# Altium footprint library Test.PcbLib: 245 footprints (part 7 of 17)
Each footprint in its own frame and in the unit in brackets; x right, y up, seen from the top. Pads: shape width x height; smd on the part's side, far side on the other; paste and mask are expansions set on the pad; w line width, h text height; cw(c..) or ccw(c..) is an arc to the next point about the centre after c.
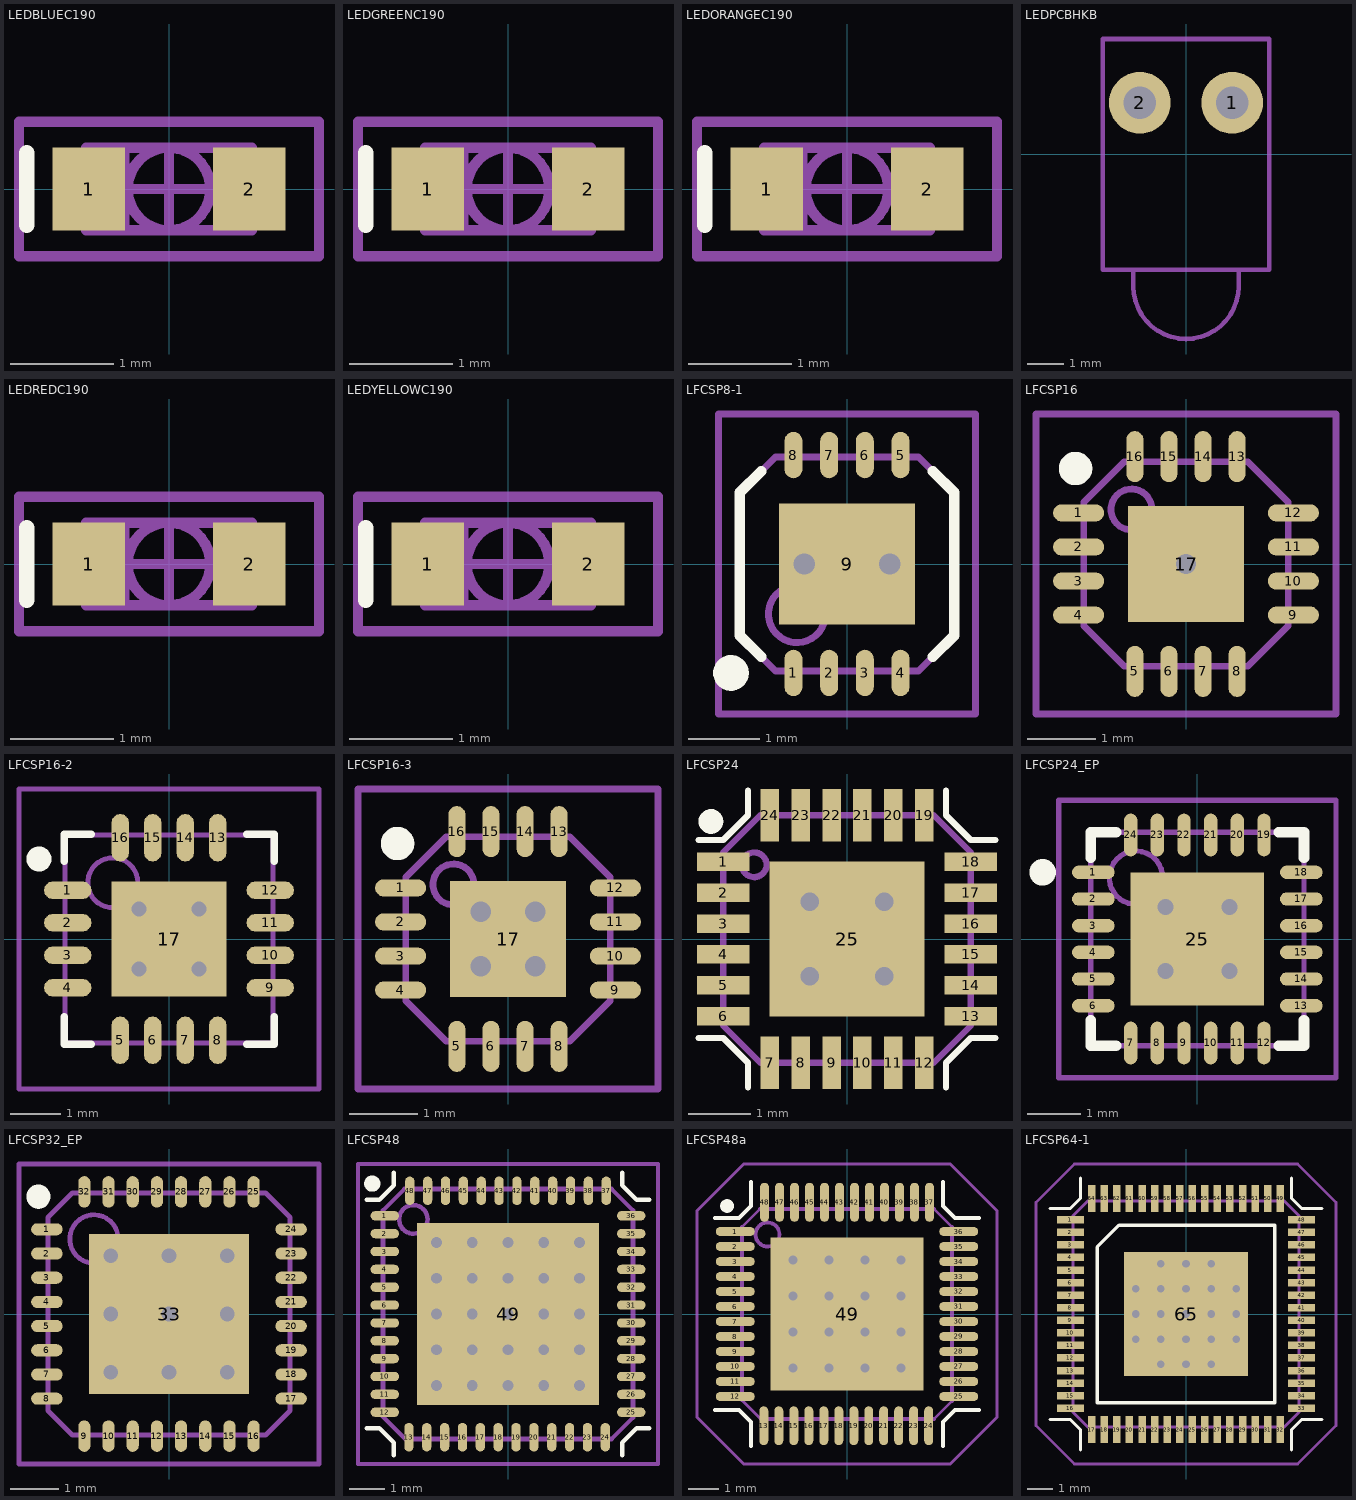
[diagram p6: the footprints below, top view; thin cyan lines are the x and y axes]

## LEDBLUEC190 [mm] "LED chip C190 1.6x0.8x0.8mm vertical"
height 0.8
pads (2):
  rect 0.7x0.8 smd: 1(-0.775,0) 2(0.775,0)
Top Overlay:
  lines w0.15: -1.375,-0.35 -1.375,0.35
Mechanical 13:
  circle w0.102: c0,0 r0.4
  rectangle: -0.8,-0.4 -0.381,0.4
  lines w0.1: -0.8,-0.4 -0.8,0.4 0.8,0.4 0.8,-0.4 -0.8,-0.4
Mechanical 15:
  lines w0.1: -0.4,0 0.4,0 ; 0,-0.4 0,0.4 ; -1.45,-0.65 -1.45,0.65 1.45,0.65 1.45,-0.65 -1.45,-0.65
3D body: height 0.3, standoff 0, extent -0.8,-0.4 0.8,0.4
3D body: height 0.8, standoff 0.3, extent -0.5,-0.4 0.5,0.4

## LEDGREENC190 [mm] "LED chip C190 1.6x0.8x0.8mm vertical"
height 0.8
pads (2):
  rect 0.7x0.8 smd: 1(-0.775,0) 2(0.775,0)
Top Overlay:
  lines w0.15: -1.375,-0.35 -1.375,0.35
Mechanical 13:
  circle w0.102: c0,0 r0.4
  rectangle: -0.8,-0.4 -0.381,0.4
  lines w0.1: -0.8,-0.4 -0.8,0.4 0.8,0.4 0.8,-0.4 -0.8,-0.4
Mechanical 15:
  lines w0.1: -0.4,0 0.4,0 ; 0,-0.4 0,0.4 ; -1.45,-0.65 -1.45,0.65 1.45,0.65 1.45,-0.65 -1.45,-0.65
3D body: height 0.3, standoff 0, extent -0.8,-0.4 0.8,0.4
3D body: height 0.8, standoff 0.3, extent -0.5,-0.4 0.5,0.4

## LEDORANGEC190 [mm] "LED chip C190 1.6x0.8x0.8mm vertical orange"
height 0.8
pads (2):
  rect 0.7x0.8 smd: 1(-0.775,0) 2(0.775,0)
Top Overlay:
  lines w0.15: -1.375,-0.35 -1.375,0.35
Mechanical 13:
  circle w0.102: c0,0 r0.4
  rectangle: -0.8,-0.4 -0.381,0.4
  lines w0.1: -0.8,-0.4 0.8,-0.4 0.8,0.4 -0.8,0.4 -0.8,-0.4
Mechanical 15:
  lines w0.1: -0.4,0 0.4,0 ; 0,-0.4 0,0.4 ; -1.45,-0.65 1.45,-0.65 1.45,0.65 -1.45,0.65 -1.45,-0.65
3D body: height 0.8, standoff 0.3, extent -0.5,-0.4 0.5,0.4
3D body: height 0.3, standoff 0, extent -0.8,-0.4 0.8,0.4

## LEDPCBHKB [mm] "Right angle LED indicator 4.6x6.35x7.3mm"
height 7.5
pads (2):
  round 1.7 hole 0.9: 1(1.27,1.422) 2(-1.27,1.422)
Mechanical 13:
  lines w0.127: -1.448,-3.175 -1.448,-3.632 ccw(c0,-3.632) 1.448,-3.632 1.448,-3.175 ; -2.286,-3.175 -2.286,3.175 2.286,3.175 2.286,-3.175 -2.286,-3.175
3D body: height 7.3, standoff 0, extent -2.286,-3.175 2.286,3.175

## LEDREDC190 [mm] "LED chip C190 1.6x0.8x0.8mm vertical"
height 0.8
pads (2):
  rect 0.7x0.8 smd: 1(-0.775,0) 2(0.775,0)
Top Overlay:
  lines w0.15: -1.375,-0.35 -1.375,0.35
Mechanical 13:
  circle w0.102: c0,0 r0.4
  rectangle: -0.8,-0.4 -0.381,0.4
  lines w0.1: -0.8,-0.4 -0.8,0.4 0.8,0.4 0.8,-0.4 -0.8,-0.4
Mechanical 15:
  lines w0.1: -0.4,0 0.4,0 ; 0,-0.4 0,0.4 ; -1.45,-0.65 -1.45,0.65 1.45,0.65 1.45,-0.65 -1.45,-0.65
3D body: height 0.3, standoff 0, extent -0.8,-0.4 0.8,0.4
3D body: height 0.8, standoff 0.3, extent -0.5,-0.4 0.5,0.4

## LEDYELLOWC190 [mm] "LED chip C190 1.6x0.8x0.8mm vertical"
height 0.8
pads (2):
  rect 0.7x0.8 smd: 1(-0.775,0) 2(0.775,0)
Top Overlay:
  lines w0.15: -1.375,-0.35 -1.375,0.35
Mechanical 13:
  circle w0.102: c0,0 r0.4
  rectangle: -0.8,-0.4 -0.381,0.4
  lines w0.1: -0.8,-0.4 -0.8,0.4 0.8,0.4 0.8,-0.4 -0.8,-0.4
Mechanical 15:
  lines w0.1: -0.4,0 0.4,0 ; 0,-0.4 0,0.4 ; -1.45,-0.65 -1.45,0.65 1.45,0.65 1.45,-0.65 -1.45,-0.65
3D body: height 0.3, standoff 0, extent -0.8,-0.4 0.8,0.4
3D body: height 0.8, standoff 0.3, extent -0.5,-0.4 0.5,0.4

## LFCSP8-1 [mm]
height 0.9
pads (9):
  oval 0.25x0.65 smd mask+0.038: 1(-0.75,-1.525) 2(-0.25,-1.525) 3(0.25,-1.525) 4(0.75,-1.525) 5(0.75,1.525) 6(0.25,1.525) 7(-0.25,1.525) 8(-0.75,1.525)
  rect 1.9x1.7 smd paste-4 mask-4: 9(0,0)
via 0.6,0 diameter 0.65 hole 0.3
via -0.6,0 diameter 0.65 hole 0.3
Top Overlay:
  circle w0.25: c-1.625,-1.525 r0.125
  lines w0.15: -1.2,-1.3 -1.5,-1 -1.5,1 -1.2,1.3 ; 1.2,-1.3 1.5,-1 1.5,1 1.2,1.3
Top Paste:
  region: -0.95,-0.85 -0.95,-0.3 -0.45,-0.3 -0.3,-0.15 0.3,-0.15 0.45,-0.3 0.95,-0.3 0.95,-0.85
  region: -0.95,0.85 -0.95,0.3 -0.45,0.3 -0.3,0.15 0.3,0.15 0.45,0.3 0.95,0.3 0.95,0.85
Top Solder:
  region: 1,0.9 0.6,0.9 0.6,0.331 0.727,0.306 0.834,0.234 0.906,0.127 0.931,0 0.906,-0.127 0.834,-0.234 0.727,-0.306 0.6,-0.331 0.473,-0.306 0.366,-0.234 0.294,-0.127 0.269,0 0.275,0 0.269,0 0.294,0.127 0.366,0.234 0.473,0.306 0.6,0.331 0.6,0.325 0.6,0.9 0,0.9 0,-0.9 1,-0.9
  region: -1,0.9 -0.6,0.9 -0.6,0.331 -0.727,0.306 -0.834,0.234 -0.906,0.127 -0.931,0 -0.906,-0.127 -0.834,-0.234 -0.727,-0.306 -0.6,-0.331 -0.473,-0.306 -0.366,-0.234 -0.294,-0.127 -0.269,0 -0.275,0 -0.269,0 -0.294,0.127 -0.366,0.234 -0.473,0.306 -0.6,0.331 -0.6,0.325 -0.6,0.9 0,0.9 0,-0.9 -1,-0.9
Mechanical 13:
  circle w0.1: c-0.7,-0.7 r0.4
  lines w0.1: -1.5,-1 -1,-1.5 1,-1.5 1.5,-1 1.5,1 1,1.5 -1,1.5 -1.5,1 -1.5,-1
Mechanical 15:
  lines w0.1: -0.5,0 0.5,0 ; 0,-0.5 0,0.5 ; -1.8,-2.1 1.8,-2.1 1.8,2.1 -1.8,2.1 -1.8,-2.1
3D body: height 0.91, standoff 0.9, extent -1.108,-1.108 -0.292,-0.292
3D body: height 0.9, standoff 0.6, extent -1.3,-1.3 1.3,1.3
3D body: height 0.6, standoff 0.02, extent -1.5,-1.5 1.5,1.5

## LFCSP16 [mm] "Lead Frame Chip Scale Package 16 pin 3x3mm R0.5mm"
height 0.9
pads (17):
  oval 0.75x0.25 smd mask+0.051: 1(-1.575,0.75) 2(-1.575,0.25) 3(-1.575,-0.25) 4(-1.575,-0.75) 9(1.575,-0.75) 10(1.575,-0.25) 11(1.575,0.25) 12(1.575,0.75)
  oval 0.25x0.75 smd mask+0.051: 5(-0.75,-1.575) 6(-0.25,-1.575) 7(0.25,-1.575) 8(0.75,-1.575) 13(0.75,1.575) 14(0.25,1.575) 15(-0.25,1.575) 16(-0.75,1.575)
  rect 1.7x1.7 smd paste-7 mask-7: 17(0,0)
via 0,0 diameter 0.65 hole 0.3
Top Overlay:
  circle w0.25: c-1.62,1.4 r0.12
Top Paste:
  region: 0.85,-0.85 0.15,-0.85 0.15,-0.275 0.275,-0.15 0.85,-0.15
  region: 0.85,0.85 0.85,0.15 0.275,0.15 0.15,0.275 0.15,0.85
  region: -0.85,0.85 -0.15,0.85 -0.15,0.275 -0.275,0.15 -0.85,0.15
  region: -0.85,-0.85 -0.85,-0.15 -0.275,-0.15 -0.15,-0.275 -0.15,-0.85
Top Solder:
  circle w0.102: c0,0 r0.381
  region: -0.9,0.9 0.9,0.9 0.9,-0.9 0,-0.9 0,-0.375 0.125,-0.375 0.225,-0.275 0.275,-0.275 0.325,-0.225 0.325,-0.175 0.381,-0.119 0.381,0.144 0.15,0.375 -0.1,0.375 -0.15,0.325 -0.25,0.325 -0.325,0.25 -0.325,0.175 -0.375,0.125 -0.375,-0.15 -0.25,-0.275 -0.25,-0.3 -0.2,-0.35 -0.1,-0.35 -0.075,-0.375 0,-0.375 0,-0.9 -0.9,-0.9
Mechanical 13:
  circle w0.1: c-0.8,0.8 r0.3
  lines w0.1: -1.5,-0.9 -0.9,-1.5 0.9,-1.5 1.5,-0.9 1.5,0.9 0.9,1.5 -0.9,1.5 -1.5,0.9 -1.5,-0.9
Mechanical 15:
  lines w0.1: -0.5,0 0.5,0 ; 0,-0.5 0,0.5 ; -2.2,-2.2 2.2,-2.2 2.2,2.2 -2.2,2.2 -2.2,-2.2
3D body: height 0.9, standoff 0.02, extent -1.5,-1.5 1.5,1.5

## LFCSP16-2 [mm] "LFCSP_LQ, 16-Leads, Body 4x4mm , Pitch 0,65mm, IPC Low Density"
height 1.5
pads (17):
  oval 0.95x0.35 smd mask+0.051: 1(-2.025,0.975) 2(-2.025,0.325) 3(-2.025,-0.325) 4(-2.025,-0.975) 9(2.025,-0.975) 10(2.025,-0.325) 11(2.025,0.325) 12(2.025,0.975)
  oval 0.35x0.95 smd mask+0.051: 5(-0.975,-2.025) 6(-0.325,-2.025) 7(0.325,-2.025) 8(0.975,-2.025) 13(0.975,2.025) 14(0.325,2.025) 15(-0.325,2.025) 16(-0.975,2.025)
  rect 2.3x2.3 smd paste-5 mask-3: 17(0,0)
via 0.6,-0.6 diameter 0.65 hole 0.3
via -0.6,-0.6 diameter 0.65 hole 0.3
via 0.6,0.6 diameter 0.65 hole 0.3
via -0.6,0.6 diameter 0.65 hole 0.3
Top Overlay:
  circle w0.25: c-2.6,1.6 r0.125
  lines w0.15: -2.1,-1.55 -2.1,-2.1 -1.55,-2.1 ; -2.1,1.55 -2.1,2.1 -1.55,2.1 ; 1.55,-2.1 2.1,-2.1 2.1,-1.55 ; 1.55,2.1 2.1,2.1 2.1,1.55
Top Paste:
  region: -1.15,0.4 -0.875,0.4 -0.75,0.275 -0.75,-0.275 -0.875,-0.4 -1.15,-0.4
  region: -0.275,0.45 0.275,0.45 0.45,0.275 0.45,-0.275 0.275,-0.45 -0.275,-0.45 -0.45,-0.275 -0.45,0.275
  region: -1.15,-1.15 -1.15,-0.75 -0.925,-0.75 -0.8,-0.875 -0.8,-1.15
  region: 1.15,-1.15 0.75,-1.15 0.75,-0.925 0.875,-0.8 1.15,-0.8
  region: 1.15,1.15 1.15,0.75 0.925,0.75 0.8,0.875 0.8,1.15
  region: -1.15,1.15 -0.75,1.15 -0.75,0.925 -0.875,0.8 -1.15,0.8
  region: -0.4,-1.15 -0.4,-0.875 -0.275,-0.75 0.275,-0.75 0.4,-0.875 0.4,-1.15
  region: 1.15,-0.4 0.875,-0.4 0.75,-0.275 0.75,0.275 0.875,0.4 1.15,0.4
  region: 0.4,1.15 0.4,0.875 0.275,0.75 -0.275,0.75 -0.4,0.875 -0.4,1.15
Top Solder:
  region: -1.2,1.2 -0.6,1.2 -0.6,0.906 -0.717,0.883 -0.816,0.816 -0.883,0.717 -0.906,0.6 -0.883,0.483 -0.816,0.384 -0.717,0.317 -0.6,0.294 -0.6,0.3 -0.6,0.294 -0.483,0.317 -0.384,0.384 -0.317,0.483 -0.294,0.6 -0.3,0.6 -0.294,0.6 -0.317,0.717 -0.384,0.816 -0.483,0.883 -0.6,0.906 -0.6,0.9 -0.6,1.2 0.6,1.2 0.6,0.906 0.483,0.883 0.384,0.816 0.317,0.717 0.294,0.6 0.3,0.6 0.294,0.6 0.317,0.483 0.384,0.384 0.483,0.317 0.6,0.294 0.6,0.3 0.6,0.294 0.717,0.317 0.816,0.384 0.883,0.483 0.906,0.6 0.883,0.717 0.816,0.816 0.717,0.883 0.6,0.906 0.6,0.9 0.6,1.2 1.2,1.2 1.2,-1.2 0.6,-1.2 0.6,-0.906 0.717,-0.883 0.816,-0.816 0.883,-0.717 0.906,-0.6 0.883,-0.483 0.816,-0.384 0.717,-0.317 0.6,-0.294 0.6,-0.3 0.6,-0.294 0.483,-0.317 0.384,-0.384 0.317,-0.483 0.294,-0.6 0.3,-0.6 0.294,-0.6 0.317,-0.717 0.384,-0.816 0.483,-0.883 0.6,-0.906 0.6,-0.9 0.6,-1.2 -0.6,-1.2 -0.6,-0.906 -0.483,-0.883 -0.384,-0.816 -0.317,-0.717 -0.294,-0.6 -0.3,-0.6 -0.294,-0.6 -0.317,-0.483 -0.384,-0.384 -0.483,-0.317 -0.6,-0.294 -0.6,-0.3 -0.6,-0.294 -0.717,-0.317 -0.816,-0.384 -0.883,-0.483 -0.906,-0.6 -0.883,-0.717 -0.816,-0.816 -0.717,-0.883 -0.6,-0.906 -0.6,-0.9 -0.6,-1.2 -1.2,-1.2
Mechanical 13:
  circle w0.1: c-1.125,1.125 r0.5
  lines w0.1: -2.075,-2.075 2.075,-2.075 2.075,2.075 -2.075,2.075 -2.075,-2.075
Mechanical 15:
  lines w0.1: -0.5,0 0.5,0 ; 0,-0.5 0,0.5 ; -3,-3 3,-3 3,3 -3,3 -3,-3
3D body: height 1.51, standoff 1.5, extent -1.635,0.615 -0.615,1.635
3D body: height 1.5, standoff 0.01, extent -2.075,-2.075 2.075,2.075

## LFCSP16-3 [mm] "Lead Frame Chip Scale Package 16 pin 3x3mm R0.5mm"
height 0.9
pads (17):
  oval 0.75x0.25 smd mask+0.051: 1(-1.575,0.75) 2(-1.575,0.25) 3(-1.575,-0.25) 4(-1.575,-0.75) 9(1.575,-0.75) 10(1.575,-0.25) 11(1.575,0.25) 12(1.575,0.75)
  oval 0.25x0.75 smd mask+0.051: 5(-0.75,-1.575) 6(-0.25,-1.575) 7(0.25,-1.575) 8(0.75,-1.575) 13(0.75,1.575) 14(0.25,1.575) 15(-0.25,1.575) 16(-0.75,1.575)
  rect 1.7x1.7 smd paste-5 mask-5: 17(0,0)
via -0.4,0.4 diameter 0.65 hole 0.3
via -0.4,-0.4 diameter 0.65 hole 0.3
via 0.4,-0.4 diameter 0.65 hole 0.3
via 0.4,0.4 diameter 0.65 hole 0.3
Top Overlay:
  circle w0.25: c-1.62,1.4 r0.12
Top Paste:
  region: -0.737,0.559 -0.838,0.559 -0.838,0.838 -0.559,0.838 -0.559,0.737 -0.61,0.711 -0.711,0.61
  region: 0.737,0.559 0.838,0.559 0.838,0.838 0.559,0.838 0.559,0.737 0.61,0.711 0.711,0.61
  region: 0.737,-0.559 0.838,-0.559 0.838,-0.838 0.559,-0.838 0.559,-0.737 0.61,-0.711 0.711,-0.61
  region: -0.737,-0.559 -0.838,-0.559 -0.838,-0.838 -0.559,-0.838 -0.559,-0.737 -0.61,-0.711 -0.711,-0.61
  region: -0.254,0.737 -0.254,0.838 0.254,0.838 0.254,0.737 0.203,0.711 0.127,0.66 0.076,0.584 0.051,0.483 0.025,0.406 0.051,0.279 0.102,0.178 0.152,0.127 0.229,0.076 0.305,0.051 0.406,0.025 0.483,0.025 0.635,0.102 0.711,0.203 0.737,0.254 0.838,0.254 0.838,-0.254 0.737,-0.254 0.711,-0.203 0.61,-0.102 0.508,-0.051 0.432,-0.025 0.381,-0.025 0.229,-0.076 0.152,-0.127 0.102,-0.178 0.051,-0.279 0.025,-0.381 0.025,-0.432 0.076,-0.584 0.127,-0.66 0.178,-0.711 0.254,-0.737 0.254,-0.838 -0.254,-0.838 -0.254,-0.737 -0.178,-0.686 -0.076,-0.584 -0.051,-0.533 -0.025,-0.457 -0.025,-0.381 -0.076,-0.229 -0.127,-0.152 -0.203,-0.076 -0.305,-0.051 -0.381,-0.025 -0.483,-0.051 -0.508,-0.051 -0.61,-0.102 -0.66,-0.152 -0.711,-0.229 -0.737,-0.254 -0.838,-0.254 -0.838,0.254 -0.737,0.254 -0.711,0.203 -0.686,0.178 -0.66,0.127 -0.635,0.102 -0.533,0.051 -0.483,0.051 -0.406,0.025 -0.33,0.025 -0.279,0.051 -0.203,0.076 -0.127,0.152 -0.076,0.229 -0.025,0.381 -0.025,0.483 -0.127,0.635 -0.203,0.711
  lines w0.025: -0.738,-0.253 cw(c-0.4,-0.4) -0.253,-0.738 ; -0.738,0.253 ccw(c-0.4,0.4) -0.253,0.738 ; -0.733,-0.557 ccw(c-0.4,-0.4) -0.557,-0.733 ; -0.733,0.557 cw(c-0.4,0.4) -0.557,0.733 ; 0.253,-0.738 cw(c0.4,-0.4) 0.738,-0.253 ; 0.253,0.738 ccw(c0.4,0.4) 0.738,0.253 ; 0.557,-0.733 ccw(c0.4,-0.4) 0.733,-0.557 ; 0.557,0.733 cw(c0.4,0.4) 0.733,0.557
Top Solder:
  drawing of 11 lines, arcs and shapes, not listed
Mechanical 13:
  circle w0.1: c-0.8,0.8 r0.3
  lines w0.1: -1.5,-0.9 -0.9,-1.5 0.9,-1.5 1.5,-0.9 1.5,0.9 0.9,1.5 -0.9,1.5 -1.5,0.9 -1.5,-0.9
Mechanical 15:
  lines w0.1: -0.5,0 0.5,0 ; 0,-0.5 0,0.5 ; -2.2,-2.2 2.2,-2.2 2.2,2.2 -2.2,2.2 -2.2,-2.2
3D body: height 0.9, standoff 0.02, extent -1.5,-1.5 1.5,1.5

## LFCSP24 [mm]
height 0.85
pads (25):
  rect 0.85x0.3 smd mask+0.051: 1(-2,1.25) 2(-2,0.75) 3(-2,0.25) 4(-2,-0.25) 5(-2,-0.75) 6(-2,-1.25) 13(2,-1.25) 14(2,-0.75) 15(2,-0.25) 16(2,0.25) 17(2,0.75) 18(2,1.25)
  rect 0.3x0.85 smd mask+0.051: 7(-1.25,-2) 8(-0.75,-2) 9(-0.25,-2) 10(0.25,-2) 11(0.75,-2) 12(1.25,-2) 19(1.25,2) 20(0.75,2) 21(0.25,2) 22(-0.25,2) 23(-0.75,2) 24(-1.25,2)
  rect 2.5x2.5 smd paste-5 mask-5: 25(0,0)
via -0.6,0.6 diameter 0.65 hole 0.3
via -0.6,-0.6 diameter 0.65 hole 0.3
via 0.6,0.6 diameter 0.65 hole 0.3
via 0.6,-0.6 diameter 0.65 hole 0.3
Top Overlay:
  circle w0.2: c-2.2,1.9 r0.1
  lines w0.102: -2.4,-1.6 -2,-1.6 -1.6,-2 -1.6,-2.4 ; -2.4,1.6 -2,1.6 -1.6,2 -1.6,2.4 ; 1.6,-2.4 1.6,-2 2,-1.6 2.4,-1.6 ; 1.6,2.4 1.6,2 2,1.6 2.4,1.6
Top Paste:
  region: 0.4,1.25 0.4,0.875 0.275,0.75 -0.275,0.75 -0.4,0.875 -0.4,1.25
  region: 1.25,-0.4 0.875,-0.4 0.75,-0.275 0.75,0.275 0.875,0.4 1.25,0.4
  region: -0.4,-1.25 -0.4,-0.875 -0.275,-0.75 0.275,-0.75 0.4,-0.875 0.4,-1.25
  region: 1.25,1.25 1.25,0.75 0.925,0.75 0.8,0.875 0.8,1.25
  region: 1.25,-1.25 0.75,-1.25 0.75,-0.925 0.875,-0.8 1.25,-0.8
  region: -1.25,-1.25 -1.25,-0.75 -0.925,-0.75 -0.8,-0.875 -0.8,-1.25
  region: -1.25,1.25 -0.75,1.25 -0.75,0.925 -0.875,0.8 -1.25,0.8
  region: -0.275,0.45 0.275,0.45 0.45,0.275 0.45,-0.275 0.275,-0.45 -0.275,-0.45 -0.45,-0.275 -0.45,0.275
  region: -1.25,0.4 -0.875,0.4 -0.75,0.275 -0.75,-0.275 -0.875,-0.4 -1.25,-0.4
Top Solder:
  region: -1.3,1.3 -0.6,1.3 -0.6,0.931 -0.727,0.906 -0.834,0.834 -0.906,0.727 -0.931,0.6 -0.906,0.473 -0.834,0.366 -0.727,0.294 -0.6,0.269 -0.6,0.275 -0.6,0.269 -0.473,0.294 -0.366,0.366 -0.294,0.473 -0.269,0.6 -0.275,0.6 -0.269,0.6 -0.294,0.727 -0.366,0.834 -0.473,0.906 -0.6,0.931 -0.6,0.925 -0.6,1.3 0,1.3 0,0 -1.3,0
  region: -1.3,-1.3 -0.6,-1.3 -0.6,-0.931 -0.727,-0.906 -0.834,-0.834 -0.906,-0.727 -0.931,-0.6 -0.906,-0.473 -0.834,-0.366 -0.727,-0.294 -0.6,-0.269 -0.6,-0.275 -0.6,-0.269 -0.473,-0.294 -0.366,-0.366 -0.294,-0.473 -0.269,-0.6 -0.275,-0.6 -0.269,-0.6 -0.294,-0.727 -0.366,-0.834 -0.473,-0.906 -0.6,-0.931 -0.6,-0.925 -0.6,-1.3 0,-1.3 0,0 -1.3,0
  region: 1.3,-1.3 0.6,-1.3 0.6,-0.931 0.727,-0.906 0.834,-0.834 0.906,-0.727 0.931,-0.6 0.906,-0.473 0.834,-0.366 0.727,-0.294 0.6,-0.269 0.6,-0.275 0.6,-0.269 0.473,-0.294 0.366,-0.366 0.294,-0.473 0.269,-0.6 0.275,-0.6 0.269,-0.6 0.294,-0.727 0.366,-0.834 0.473,-0.906 0.6,-0.931 0.6,-0.925 0.6,-1.3 0,-1.3 0,0 1.3,0
  region: 1.3,1.3 0.6,1.3 0.6,0.931 0.727,0.906 0.834,0.834 0.906,0.727 0.931,0.6 0.906,0.473 0.834,0.366 0.727,0.294 0.6,0.269 0.6,0.275 0.6,0.269 0.473,0.294 0.366,0.366 0.294,0.473 0.269,0.6 0.275,0.6 0.269,0.6 0.294,0.727 0.366,0.834 0.473,0.906 0.6,0.931 0.6,0.925 0.6,1.3 0,1.3 0,0 1.3,0
Mechanical 13:
  circle w0.102: c-1.5,1.2 r0.2
  lines w0.102: -2,-1.4 -1.4,-2 1.4,-2 2,-1.4 2,1.4 1.4,2 -1.4,2 -2,1.4 -2,-1.4
Mechanical 15:
  lines w0.1: -0.5,0 0.5,0 ; 0,-0.5 0,0.5
3D body: height 0.85, standoff 0, extent -2,-2 2,2

## LFCSP24_EP [mm] "QFN, 24-Leads, Body 4,0x4,0mm (max), Pitch 0,50mm, IPC Medium Density"
height 1
pads (25):
  oval 0.8x0.25 smd mask+0.051: 1(-1.95,1.25) 2(-1.95,0.75) 3(-1.95,0.25) 4(-1.95,-0.25) 5(-1.95,-0.75) 6(-1.95,-1.25) 13(1.95,-1.25) 14(1.95,-0.75) 15(1.95,-0.25) 16(1.95,0.25) 17(1.95,0.75) 18(1.95,1.25)
  oval 0.25x0.8 smd mask+0.051: 7(-1.25,-1.95) 8(-0.75,-1.95) 9(-0.25,-1.95) 10(0.25,-1.95) 11(0.75,-1.95) 12(1.25,-1.95) 19(1.25,1.95) 20(0.75,1.95) 21(0.25,1.95) 22(-0.25,1.95) 23(-0.75,1.95) 24(-1.25,1.95)
  rect 2.5x2.5 smd paste-5 mask-5: 25(0,0)
via -0.6,0.6 diameter 0.65 hole 0.3
via -0.6,-0.6 diameter 0.65 hole 0.3
via 0.6,0.6 diameter 0.65 hole 0.3
via 0.6,-0.6 diameter 0.65 hole 0.3
Top Overlay:
  circle w0.25: c-2.9,1.25 r0.125
  lines w0.2: -2,-1.525 -2,-2 -1.525,-2 ; -2,1.525 -2,2 -1.525,2 ; 1.525,-2 2,-2 2,-1.525 ; 1.525,2 2,2 2,1.525
Top Paste:
  region: 0.4,1.25 0.4,0.875 0.275,0.75 -0.275,0.75 -0.4,0.875 -0.4,1.25
  region: 1.25,-0.4 0.875,-0.4 0.75,-0.275 0.75,0.275 0.875,0.4 1.25,0.4
  region: -0.4,-1.25 -0.4,-0.875 -0.275,-0.75 0.275,-0.75 0.4,-0.875 0.4,-1.25
  region: 1.25,1.25 1.25,0.75 0.925,0.75 0.8,0.875 0.8,1.25
  region: 1.25,-1.25 0.75,-1.25 0.75,-0.925 0.875,-0.8 1.25,-0.8
  region: -1.25,-1.25 -1.25,-0.75 -0.925,-0.75 -0.8,-0.875 -0.8,-1.25
  region: -1.25,1.25 -0.75,1.25 -0.75,0.925 -0.875,0.8 -1.25,0.8
  region: -0.275,0.45 0.275,0.45 0.45,0.275 0.45,-0.275 0.275,-0.45 -0.275,-0.45 -0.45,-0.275 -0.45,0.275
  region: -1.25,0.4 -0.875,0.4 -0.75,0.275 -0.75,-0.275 -0.875,-0.4 -1.25,-0.4
Top Solder:
  region: -1.3,1.3 -0.6,1.3 -0.6,0.931 -0.727,0.906 -0.834,0.834 -0.906,0.727 -0.931,0.6 -0.906,0.473 -0.834,0.366 -0.727,0.294 -0.6,0.269 -0.6,0.275 -0.6,0.269 -0.473,0.294 -0.366,0.366 -0.294,0.473 -0.269,0.6 -0.275,0.6 -0.269,0.6 -0.294,0.727 -0.366,0.834 -0.473,0.906 -0.6,0.931 -0.6,0.925 -0.6,1.3 0,1.3 0,0 -1.3,0
  region: -1.3,-1.3 -0.6,-1.3 -0.6,-0.931 -0.727,-0.906 -0.834,-0.834 -0.906,-0.727 -0.931,-0.6 -0.906,-0.473 -0.834,-0.366 -0.727,-0.294 -0.6,-0.269 -0.6,-0.275 -0.6,-0.269 -0.473,-0.294 -0.366,-0.366 -0.294,-0.473 -0.269,-0.6 -0.275,-0.6 -0.269,-0.6 -0.294,-0.727 -0.366,-0.834 -0.473,-0.906 -0.6,-0.931 -0.6,-0.925 -0.6,-1.3 0,-1.3 0,0 -1.3,0
  region: 1.3,-1.3 0.6,-1.3 0.6,-0.931 0.727,-0.906 0.834,-0.834 0.906,-0.727 0.931,-0.6 0.906,-0.473 0.834,-0.366 0.727,-0.294 0.6,-0.269 0.6,-0.275 0.6,-0.269 0.473,-0.294 0.366,-0.366 0.294,-0.473 0.269,-0.6 0.275,-0.6 0.269,-0.6 0.294,-0.727 0.366,-0.834 0.473,-0.906 0.6,-0.931 0.6,-0.925 0.6,-1.3 0,-1.3 0,0 1.3,0
  region: 1.3,1.3 0.6,1.3 0.6,0.931 0.727,0.906 0.834,0.834 0.906,0.727 0.931,0.6 0.906,0.473 0.834,0.366 0.727,0.294 0.6,0.269 0.6,0.275 0.6,0.269 0.473,0.294 0.366,0.366 0.294,0.473 0.269,0.6 0.275,0.6 0.269,0.6 0.294,0.727 0.366,0.834 0.473,0.906 0.6,0.931 0.6,0.925 0.6,1.3 0,1.3 0,0 1.3,0
Mechanical 13:
  circle w0.1: c-1.15,1.15 r0.5
  lines w0.1: -2,-2 2,-2 2,2 -2,2 -2,-2
Mechanical 15:
  lines w0.1: -0.5,0 0.5,0 ; 0,-0.5 0,0.5 ; -2.6,-2.6 2.6,-2.6 2.6,2.6 -2.6,2.6 -2.6,-2.6
3D body: height 1, standoff 0.05, extent -2,-2 2,2
3D body: height 1.01, standoff 1, extent -1.66,0.64 -0.64,1.66

## LFCSP32_EP [mm] "QFN, 32-Leads, Body 5,0x5,0mm (max), Pitch 0,50mm, IPC Medium Density"
height 1
pads (33):
  oval 0.65x0.25 smd mask+0.038: 1(-2.525,1.75) 2(-2.525,1.25) 3(-2.525,0.75) 4(-2.525,0.25) 5(-2.525,-0.25) 6(-2.525,-0.75) 7(-2.525,-1.25) 8(-2.525,-1.75) 17(2.525,-1.75) 18(2.525,-1.25) 19(2.525,-0.75) 20(2.525,-0.25) 21(2.525,0.25) 22(2.525,0.75) 23(2.525,1.25) 24(2.525,1.75)
  oval 0.25x0.65 smd mask+0.038: 9(-1.75,-2.525) 10(-1.25,-2.525) 11(-0.75,-2.525) 12(-0.25,-2.525) 13(0.25,-2.525) 14(0.75,-2.525) 15(1.25,-2.525) 16(1.75,-2.525) 25(1.75,2.525) 26(1.25,2.525) 27(0.75,2.525) 28(0.25,2.525) 29(-0.25,2.525) 30(-0.75,2.525) 31(-1.25,2.525) 32(-1.75,2.525)
  rect 3.3x3.3 smd paste-3 mask-3: 33(0,0)
via -1.2,1.2 diameter 0.6 hole 0.3
via 0,1.2 diameter 0.6 hole 0.3
via 1.2,1.2 diameter 0.6 hole 0.3
via -1.2,0 diameter 0.6 hole 0.3
via 0,0 diameter 0.6 hole 0.3
via 1.2,0 diameter 0.6 hole 0.3
via -1.2,-1.2 diameter 0.6 hole 0.3
via 0,-1.2 diameter 0.6 hole 0.3
via 1.2,-1.2 diameter 0.6 hole 0.3
Top Overlay:
  circle w0.25: c-2.7,2.425 r0.125
Top Paste:
  region: 1.625,0.2 1.475,0.2 1.35,0.325 1.35,0.875 1.475,1 1.625,1
  region: 1.625,-1 1.475,-1 1.35,-0.875 1.35,-0.325 1.475,-0.2 1.625,-0.2
  region: 0.2,-1.625 0.2,-1.475 0.325,-1.35 0.875,-1.35 1,-1.475 1,-1.625
  region: -1,-1.625 -1,-1.475 -0.875,-1.35 -0.325,-1.35 -0.2,-1.475 -0.2,-1.625
  region: -1.625,-0.2 -1.475,-0.2 -1.35,-0.325 -1.35,-0.875 -1.475,-1 -1.625,-1
  region: -1.625,1 -1.475,1 -1.35,0.875 -1.35,0.325 -1.475,0.2 -1.625,0.2
  region: -0.2,1.625 -0.2,1.475 -0.325,1.35 -0.875,1.35 -1,1.475 -1,1.625
  region: 1,1.625 1,1.475 0.875,1.35 0.325,1.35 0.2,1.475 0.2,1.625
  region: 1.05,0.875 1.05,0.325 0.875,0.15 0.325,0.15 0.15,0.325 0.15,0.875 0.325,1.05 0.875,1.05
  region: 0.875,-1.05 0.325,-1.05 0.15,-0.875 0.15,-0.325 0.325,-0.15 0.875,-0.15 1.05,-0.325 1.05,-0.875
  region: -1.05,-0.875 -1.05,-0.325 -0.875,-0.15 -0.325,-0.15 -0.15,-0.325 -0.15,-0.875 -0.325,-1.05 -0.875,-1.05
  region: -0.875,1.05 -0.325,1.05 -0.15,0.875 -0.15,0.325 -0.325,0.15 -0.875,0.15 -1.05,0.325 -1.05,0.875
Top Solder:
  drawing of 2 lines, arcs and shapes, not listed
Mechanical 13:
  circle w0.1: c-1.55,1.55 r0.5
  lines w0.1: -2.5,-2 -2.5,2 -2,2.5 2,2.5 2.5,2 2.5,-2 2,-2.5 -2,-2.5 -2.5,-2
Mechanical 15:
  lines w0.1: -0.5,0 0.5,0 ; 0,-0.5 0,0.5 ; -3.1,-3.1 -3.1,3.1 3.1,3.1 3.1,-3.1 -3.1,-3.1
3D body: height 1, standoff 0.02, extent -2.5,-2.5 2.5,2.5
3D body: height 1.01, standoff 1, extent -2.06,1.04 -1.04,2.06

## LFCSP48 [mm] "LFCSP48  48pin 7x7mm R0.5mm H1mm"
height 1
pads (49):
  oval 0.8x0.26 smd mask+0.051: 1(-3.45,2.75) 2(-3.45,2.25) 3(-3.45,1.75) 4(-3.45,1.25) 5(-3.45,0.75) 6(-3.45,0.25) 7(-3.45,-0.25) 8(-3.45,-0.75) 9(-3.45,-1.25) 10(-3.45,-1.75) 11(-3.45,-2.25) 12(-3.45,-2.75) 25(3.45,-2.75) 26(3.45,-2.25) 27(3.45,-1.75) 28(3.45,-1.25) 29(3.45,-0.75) 30(3.45,-0.25) 31(3.45,0.25) 32(3.45,0.75) 33(3.45,1.25) 34(3.45,1.75) 35(3.45,2.25) 36(3.45,2.75)
  oval 0.26x0.8 smd mask+0.051: 13(-2.775,-3.45) 14(-2.275,-3.45) 15(-1.775,-3.45) 16(-1.275,-3.45) 17(-0.775,-3.45) 18(-0.275,-3.45) 19(0.225,-3.45) 20(0.725,-3.45) 21(1.225,-3.45) 22(1.725,-3.45) 23(2.225,-3.45) 24(2.725,-3.45) 37(2.75,3.45) 38(2.25,3.45) 39(1.75,3.45) 40(1.25,3.45) 41(0.75,3.45) 42(0.25,3.45) 43(-0.25,3.45) 44(-0.75,3.45) 45(-1.25,3.45) 46(-1.75,3.45) 47(-2.25,3.45) 48(-2.75,3.45)
  rect 5.1x5.1 smd paste-5 mask-5: 49(0,0)
via 0,-2 diameter 0.6 hole 0.3
via 1,-2 diameter 0.6 hole 0.3
via 2,-2 diameter 0.6 hole 0.3
via -1,-2 diameter 0.6 hole 0.3
via -2,-2 diameter 0.6 hole 0.3
via 0,-1 diameter 0.6 hole 0.3
via 1,-1 diameter 0.6 hole 0.3
via 2,-1 diameter 0.6 hole 0.3
via -1,-1 diameter 0.6 hole 0.3
via -2,-1 diameter 0.6 hole 0.3
via 0,2 diameter 0.6 hole 0.3
via 1,2 diameter 0.6 hole 0.3
via 2,2 diameter 0.6 hole 0.3
via -1,2 diameter 0.6 hole 0.3
via -2,2 diameter 0.6 hole 0.3
via 0,1 diameter 0.6 hole 0.3
via 1,1 diameter 0.6 hole 0.3
via 2,1 diameter 0.6 hole 0.3
via -1,1 diameter 0.6 hole 0.3
via -2,1 diameter 0.6 hole 0.3
via -2,0 diameter 0.6 hole 0.3
via -1,0 diameter 0.6 hole 0.3
via 2,0 diameter 0.6 hole 0.3
via 1,0 diameter 0.6 hole 0.3
via 0,0 diameter 0.6 hole 0.3
Top Overlay:
  circle w0.254: c-3.8,3.65 r0.1
  lines w0.127: -3.95,-3.2 -3.6,-3.2 -3.2,-3.6 -3.2,-3.95 ; -3.95,3.2 -3.6,3.2 -3.2,3.6 -3.2,3.95 ; 3.2,-3.95 3.2,-3.6 3.6,-3.2 3.95,-3.2 ; 3.2,3.95 3.2,3.6 3.6,3.2 3.95,3.2
Top Paste:
  drawing of 36 lines, arcs and shapes, not listed
Top Solder:
  drawing of 2 lines, arcs and shapes, not listed
Mechanical 13:
  circle w0.127: c-2.65,2.65 r0.4
  lines w0.127: -3.5,-2.875 -2.875,-3.5 2.9,-3.5 3.5,-2.9 3.5,2.9 2.9,3.5 -2.9,3.5 -3.5,2.9 -3.5,-2.875
Mechanical 15:
  lines w0.1: -0.508,0 0.508,0 ; 0,-0.508 0,0.508
  lines w0.102: -4.2,-4.2 4.2,-4.2 4.2,4.2 -4.2,4.2 -4.2,-4.2
3D body: height 1.02, standoff 1, extent -3.056,2.227 -2.242,3.056
3D body: height 1, standoff 0, extent -3.5,-3.5 3.5,3.5

## LFCSP48a [mm]
height 1
pads (49):
  oval 1.3x0.3 smd mask+0.051: 1(-3.725,2.75) 2(-3.725,2.25) 3(-3.725,1.75) 4(-3.725,1.25) 5(-3.725,0.75) 6(-3.725,0.25) 7(-3.725,-0.25) 8(-3.725,-0.75) 9(-3.725,-1.25) 10(-3.725,-1.75) 11(-3.725,-2.25) 12(-3.725,-2.75) 25(3.725,-2.75) 26(3.725,-2.25) 27(3.725,-1.75) 28(3.725,-1.25) 29(3.725,-0.75) 30(3.725,-0.25) 31(3.725,0.25) 32(3.725,0.75) 33(3.725,1.25) 34(3.725,1.75) 35(3.725,2.25) 36(3.725,2.75)
  oval 0.3x1.3 smd mask+0.051: 13(-2.775,-3.725) 14(-2.275,-3.725) 15(-1.775,-3.725) 16(-1.275,-3.725) 17(-0.775,-3.725) 18(-0.275,-3.725) 19(0.225,-3.725) 20(0.725,-3.725) 21(1.225,-3.725) 22(1.725,-3.725) 23(2.225,-3.725) 24(2.725,-3.725) 37(2.75,3.725) 38(2.25,3.725) 39(1.75,3.725) 40(1.25,3.725) 41(0.75,3.725) 42(0.25,3.725) 43(-0.25,3.725) 44(-0.75,3.725) 45(-1.25,3.725) 46(-1.75,3.725) 47(-2.25,3.725) 48(-2.75,3.725)
  rect 5.1x5.1 smd paste-5 mask-5: 49(0,0)
via -0.6,-0.6 diameter 0.65 hole 0.3
via -0.6,0.6 diameter 0.65 hole 0.3
via -0.6,1.8 diameter 0.65 hole 0.3
via -0.6,-1.8 diameter 0.65 hole 0.3
via 0.6,-1.8 diameter 0.65 hole 0.3
via 0.6,1.8 diameter 0.65 hole 0.3
via 0.6,0.6 diameter 0.65 hole 0.3
via 0.6,-0.6 diameter 0.65 hole 0.3
via -1.8,-1.8 diameter 0.65 hole 0.3
via -1.8,1.8 diameter 0.65 hole 0.3
via -1.8,0.6 diameter 0.65 hole 0.3
via -1.8,-0.6 diameter 0.65 hole 0.3
via 1.8,-1.8 diameter 0.65 hole 0.3
via 1.8,1.8 diameter 0.65 hole 0.3
via 1.8,0.6 diameter 0.65 hole 0.3
via 1.8,-0.6 diameter 0.65 hole 0.3
Top Overlay:
  circle w0.254: c-4,3.6 r0.1
  lines w0.127: -4.4,-3.2 -3.6,-3.2 -3.2,-3.6 -3.2,-4.4 ; -4.4,3.2 -3.6,3.2 -3.2,3.6 -3.2,4.4 ; 3.2,-4.4 3.2,-3.6 3.6,-3.2 4.4,-3.2 ; 3.2,4.4 3.2,3.6 3.6,3.2 4.4,3.2
Top Paste:
  drawing of 25 lines, arcs and shapes, not listed
Top Solder:
  drawing of 16 lines, arcs and shapes, not listed
Mechanical 3:
  lines w0.102: -5,-3.445 -3.445,-5 ; -5,3.445 -3.445,5 ; 3.445,-5 5,-3.445 ; 3.445,5 5,3.445
Mechanical 13:
  circle w0.127: c-2.65,2.65 r0.4
  lines w0.102: -3.5,-2.875 -2.875,-3.5 ; -3.5,2.9 -2.9,3.5 ; 2.9,-3.5 3.5,-2.9 ; 2.9,3.5 3.5,2.9
  lines w0.127: -3.5,-2.875 -3.5,2.9 ; -2.9,3.5 2.9,3.5 ; -2.875,-3.5 2.9,-3.5 ; 3.5,-2.9 3.5,2.9
Mechanical 15:
  lines w0.1: -0.508,0 0.508,0 ; 0,-0.508 0,0.508
  lines w0.102: -5,-3.445 -5,3.445 ; -3.445,-5 3.445,-5 ; -3.445,5 3.445,5 ; 5,-3.445 5,3.445
3D body: height 1.02, standoff 1, extent -3.056,2.227 -2.242,3.056
3D body: height 1, standoff 0, extent -3.5,-3.5 3.5,3.5

## LFCSP64-1 [mm]
height 2.2
pads (65):
  rect 1.067x0.3 smd paste+0 mask+0.051: 1(-4.597,3.75) 2(-4.597,3.25) 3(-4.597,2.75) 4(-4.597,2.25) 5(-4.597,1.75) 6(-4.597,1.25) 7(-4.597,0.75) 8(-4.597,0.25) 9(-4.597,-0.25) 10(-4.597,-0.75) 11(-4.597,-1.25) 12(-4.597,-1.75) 13(-4.597,-2.25) 14(-4.597,-2.75) 15(-4.597,-3.25) 16(-4.597,-3.75) 33(4.597,-3.75) 34(4.597,-3.25) 35(4.597,-2.75) 36(4.597,-2.25) 37(4.597,-1.75) 38(4.597,-1.25) 39(4.597,-0.75) 40(4.597,-0.25) 41(4.597,0.25) 42(4.597,0.75) 43(4.597,1.25) 44(4.597,1.75) 45(4.597,2.25) 46(4.597,2.75) 47(4.597,3.25) 48(4.597,3.75)
  rect 0.3x1.067 smd paste+0 mask+0.051: 17(-3.75,-4.597) 18(-3.25,-4.597) 19(-2.75,-4.597) 20(-2.25,-4.597) 21(-1.75,-4.597) 22(-1.25,-4.597) 23(-0.75,-4.597) 24(-0.25,-4.597) 25(0.25,-4.597) 26(0.75,-4.597) 27(1.25,-4.597) 28(1.75,-4.597) 29(2.25,-4.597) 30(2.75,-4.597) 31(3.25,-4.597) 32(3.75,-4.597) 49(3.75,4.597) 50(3.25,4.597) 51(2.75,4.597) 52(2.25,4.597) 53(1.75,4.597) 54(1.25,4.597) 55(0.75,4.597) 56(0.25,4.597) 57(-0.25,4.597) 58(-0.75,4.597) 59(-1.25,4.597) 60(-1.75,4.597) 61(-2.25,4.597) 62(-2.75,4.597) 63(-3.25,4.597) 64(-3.75,4.597)
  rect 4.928x4.928 smd paste-12.7 mask-5: 65(0,0)
via 1,2 diameter 0.65 hole 0.3
via 0,2 diameter 0.65 hole 0.3
via -1,2 diameter 0.65 hole 0.3
via -2,1 diameter 0.65 hole 0.3
via -1,1 diameter 0.65 hole 0.3
via 0,1 diameter 0.65 hole 0.3
via 1,1 diameter 0.65 hole 0.3
via 2,1 diameter 0.65 hole 0.3
via 2,0 diameter 0.65 hole 0.3
via 1,0 diameter 0.65 hole 0.3
via 0,0 diameter 0.65 hole 0.3
via -1,0 diameter 0.65 hole 0.3
via -2,0 diameter 0.65 hole 0.3
via -2,-1 diameter 0.65 hole 0.3
via -1,-1 diameter 0.65 hole 0.3
via 0,-1 diameter 0.65 hole 0.3
via 1,-1 diameter 0.65 hole 0.3
via 2,-1 diameter 0.65 hole 0.3
via 1,-2 diameter 0.65 hole 0.3
via 0,-2 diameter 0.65 hole 0.3
via -1,-2 diameter 0.65 hole 0.3
Top Overlay:
  lines w0.127: -5.4,-4.2 -4.6,-4.2 -4.2,-4.6 -4.2,-5.4 ; -5.4,4.2 -4.6,4.2 -4.2,4.6 -4.2,5.4 ; 4.2,-5.4 4.2,-4.6 4.6,-4.2 5.4,-4.2 ; 4.2,5.4 4.2,4.6 4.6,4.2 5.4,4.2 ; -3.528,-3.528 3.528,-3.528 3.528,3.528 -2.672,3.528 -3.528,2.672 -3.528,-3.528
Top Paste:
  drawing of 28 lines, arcs and shapes, not listed
Top Solder:
  drawing of 2 lines, arcs and shapes, not listed
Mechanical 13:
  lines w0.127: -4.5,-3.9 -3.9,-4.5 3.9,-4.5 4.5,-3.9 4.5,3.9 3.9,4.5 -3.9,4.5 -4.5,3.9 -4.5,-3.9
Mechanical 15:
  lines w0.1: -0.508,0 0.508,0 ; 0,-0.508 0,0.508
  lines w0.102: -5.969,-4.445 -5.969,4.445 -4.445,5.969 4.445,5.969 5.969,4.445 5.969,-4.445 4.445,-5.969 -4.445,-5.969 -5.969,-4.445
3D body: height 1, standoff 0, extent -4.5,-4.6 4.5,4.4